# Altium footprint library FOC.PcbLib: 148 footprints (part 8 of 10)
Each footprint in its own frame and in the unit in brackets; x right, y up, seen from the top. Pads: shape width x height; smd on the part's side, far side on the other; paste and mask are expansions set on the pad; w line width, h text height; cw(c..) or ccw(c..) is an arc to the next point about the centre after c.
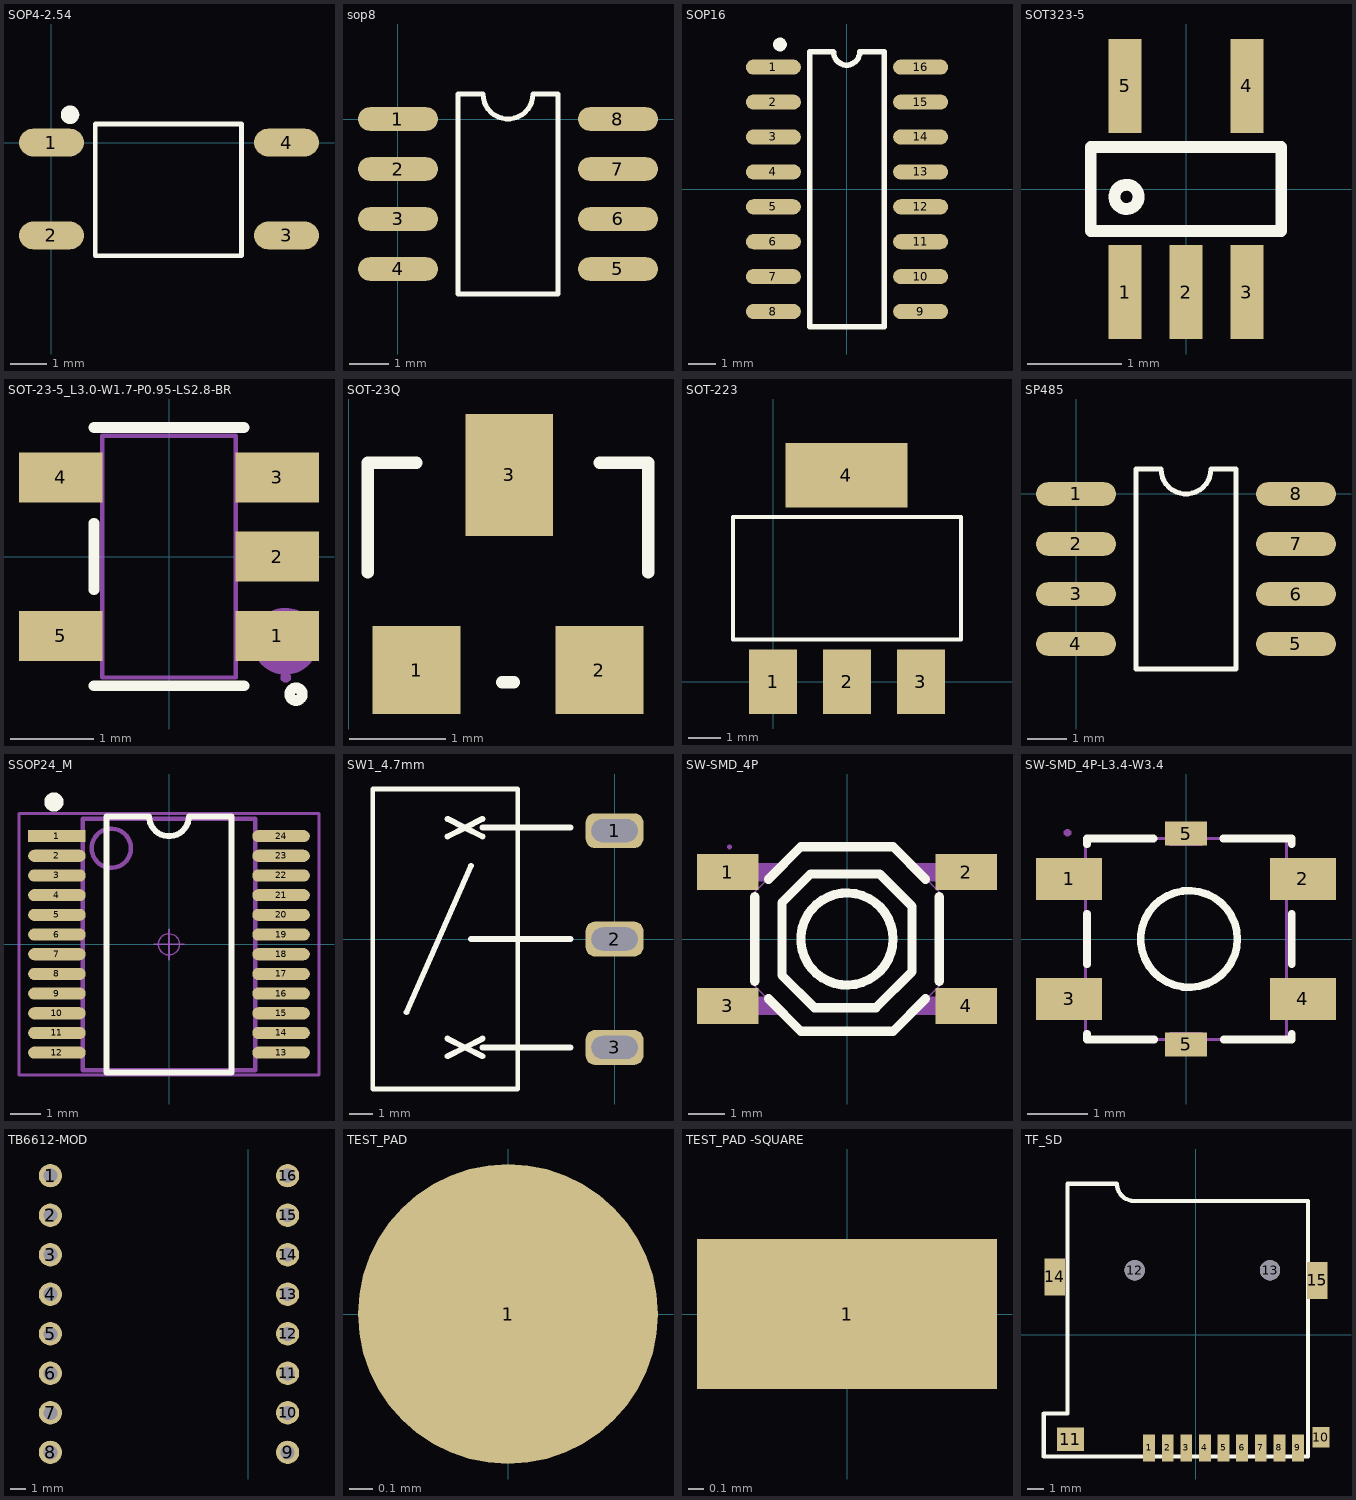
[diagram p7: the footprints below, top view; thin cyan lines are the x and y axes]

## SOP4-2.54 [mil] "间距2.54mm（蒜米工坊）"
pads (4):
  oval 70x30 smd: 1(0,0) 2(0,-100) 3(253.23,-100) 4(253.23,0)
Top Overlay:
  circle w10: c20,30 r4.92
  lines w5: 47.24,-121.73 204.72,-121.73 204.72,20 47.24,20 47.24,-121.73
3D body "SOP-42.STEP": height 78.74, standoff -3.96, extent -12.79,-120.87 262.8,20.87

## sop8 [mil]
height 137.8
pads (8):
  oval 80x23.62 smd: 1(0,0) 2(0,-50) 3(0,-100) 4(0,-150) 5(220,-150) 6(220,-100) 7(220,-50) 8(220,0)
Top Overlay:
  lines w5: 60,-175 60,25 85,25 ccw(c110,25) 135,25 160,25 160,-175 60,-175
3D body "SO8.STEP": height 57, standoff 0, extent -2.75,-172.01 224.74,20.99

## SOP16 [mm] "（蒜米工坊）"
height 1.75
pads (16):
  oval 2x0.55 smd: 1(-2.667,4.445) 2(-2.667,3.175) 3(-2.667,1.905) 4(-2.667,0.635) 5(-2.667,-0.635) 6(-2.667,-1.905) 7(-2.667,-3.175) 8(-2.667,-4.445) 9(2.692,-4.445) 10(2.692,-3.175) 11(2.692,-1.905) 12(2.692,-0.635) 13(2.692,0.635) 14(2.692,1.905) 15(2.692,3.175) 16(2.692,4.445)
Top Overlay:
  circle w0.25: c-2.425,5.27 r0.125
  lines w0.2: -0.483,5 -1.346,5 -1.346,-5 1.372,-5 1.372,5 0.475,5 ; -0.475,4.997 ccw(c0,4.996) 0.475,4.997
3D body "SO-16.STEP": height 1.45, standoff 0, extent -2.921,-4.991 2.984,4.991

## SOT323-5 [mm] "SC70"
pads (5):
  rect 0.35x1 smd: 1(-0.65,-1.1) 2(0,-1.1) 3(0.65,-1.1) 4(0.65,1.1) 5(-0.65,1.1)
Top Overlay:
  circle w0.127: c-0.635,-0.084 r0.13
  lines w0.127: -1.016,-0.447 1.016,-0.447 1.016,0.449 -1.016,0.449 -1.016,-0.447
3D body "sot353.step": height 1, standoff 0, extent -1.05,-1.158 1.05,1.142

## SOT-23-5_L3.0-W1.7-P0.95-LS2.8-BR [mm]
pads (5):
  rect 1x0.6 smd: 1(1.3,-0.95) 2(1.3,0) 3(1.3,0.95) 4(-1.3,0.95) 5(-1.3,-0.95)
Top Overlay:
  circle w0.127: c1.524,-1.651 r0.076
  lines w0.127: -0.9,-1.55 0.9,-1.55 ; -0.9,-0.4 -0.9,0.4 ; -0.9,1.55 0.9,1.55
Mechanical 6:
  circle w0.4: c1.397,-1.016 r0.2
Mechanical 15:
  region: 1.46,-1.45 1.46,-1.425 1.425,-1.39 1.375,-1.39 1.34,-1.425 1.34,-1.45 1.34,-1.475 1.375,-1.51 1.425,-1.51 1.46,-1.475
  region: 0.79,-1.15 0.79,-0.75 0.96,-0.75 0.96,-1.15
  region: 0.95,-1.15 0.95,-0.75 1.4,-0.75 1.4,-1.15
  region: 0.79,-0.2 0.79,0.2 0.96,0.2 0.96,-0.2
  region: 0.95,-0.2 0.95,0.2 1.4,0.2 1.4,-0.2
  region: 0.79,0.75 0.79,1.15 0.96,1.15 0.96,0.75
  region: 0.95,0.75 0.95,1.15 1.4,1.15 1.4,0.75
  region: -0.96,0.75 -0.96,1.15 -0.79,1.15 -0.79,0.75
  region: -1.4,0.75 -1.4,1.15 -0.95,1.15 -0.95,0.75
  region: -0.96,-1.15 -0.96,-0.75 -0.79,-0.75 -0.79,-1.15
  region: -1.4,-1.15 -1.4,-0.75 -0.95,-0.75 -0.95,-1.15
  lines w0.051: -0.8,-1.45 0.8,-1.45 0.8,1.45 -0.8,1.45 -0.8,-1.45
3D body "AADA.STEP": height 1.2, standoff -0.05, extent -1.506,-1.45 1.506,1.45

## SOT-23Q [mil]
pads (3):
  rect 36x36 smd: 1(27.75,-120.28) 2(102.75,-120.28)
  rect 36x50 smd: 3(65.75,-40.28)
Top Overlay:
  lines w5: 7.75,-80.28 7.75,-35.28 27.75,-35.28 ; 62.76,-125.28 67.75,-125.28 ; 102.75,-35.28 122.75,-35.28 122.75,-80.28
3D body "CircuitWorks-SOT-23.step": height 41.65, standoff -1.65, extent 5.94,-124.21 124.06,-25.79

## SOT-223 [mil]
pads (4):
  rect 59x79 smd: 1(0,0) 2(90.55,0) 3(181.1,0)
  rect 150x79 smd: 4(89.88,253.54)
Top Overlay:
  lines w5: -49.45,52 230.55,52 230.55,202 -49.45,202 -49.45,52
3D body "User Library-SOT-223-4.STEP": height 64.96, standoff 0, extent -37.95,-14.5 217.96,264.51

## SP485 [mil]
height 137.8
pads (8):
  oval 80x23.62 smd: 1(0,0) 2(0,-50) 3(0,-100) 4(0,-150) 5(220,-150) 6(220,-100) 7(220,-50) 8(220,0)
Top Overlay:
  lines w5: 60,-175 160,-175 160,25 135,25 cw(c110,25) 85,25 60,25 60,-175
3D body "SO8.STEP": height 57, standoff 0, extent -2.75,-172.01 224.74,20.99

## SSOP24_M [mm] "8.3*7.8*1.6（长宽高）"
pads (24):
  rect 1.9x0.4 smd: 1(-3.7,3.575)
  oval 1.9x0.4 smd: 2(-3.7,2.925) 3(-3.7,2.275) 4(-3.7,1.625) 5(-3.7,0.975) 6(-3.7,0.325) 7(-3.7,-0.325) 8(-3.7,-0.975) 9(-3.7,-1.625) 10(-3.7,-2.275) 11(-3.7,-2.925) 12(-3.7,-3.575) 13(3.7,-3.575) 14(3.7,-2.925) 15(3.7,-2.275) 16(3.7,-1.625) 17(3.7,-0.975) 18(3.7,-0.325) 19(3.7,0.325) 20(3.7,0.975) 21(3.7,1.625) 22(3.7,2.275) 23(3.7,2.925) 24(3.7,3.575)
Top Overlay:
  circle w0.381: c-3.8,4.7 r0.127
  lines w0.2: -2.065,-4.225 2.065,-4.225 2.065,4.225 0.655,4.225 cw(c0,4.225) -0.655,4.225 -2.065,4.225 -2.065,-4.225
Mechanical 13:
  circle w0.15: c-1.905,3.175 r0.648
  lines w0.15: -2.85,-4.15 2.85,-4.15 2.85,4.15 -2.85,4.15 -2.85,-4.15
Mechanical 15:
  circle w0.05: c0,0 r0.35
  lines w0.05: -0.5,0 0.5,0 ; 0,-0.5 0,0.5
  lines w0.1: -4.953,-4.318 4.953,-4.318 4.953,4.318 -4.953,4.318 -4.953,-4.318
3D body "SSOP24.STEP": height 1.65, standoff -0.03, extent -3.852,-4.15 3.852,4.15

## SW1_4.7mm [mm]
pads (3):
  rrect50% 2.5x1.5 hole 1 slot 2 at 0 deg: 1(0,4.699) 2(0,0) 3(0,-4.699)
Top Overlay:
  lines w0.2: -10.485,6.5 -4.191,6.5 -4.191,-6.5 -10.485,-6.5 -10.485,6.502
  lines w0.254: -9.017,-3.175 -6.223,3.175 ; -7.239,-5.08 -6.477,-4.699 ; -7.239,-4.318 -6.477,-4.699 ; -7.239,4.445 -6.477,4.826 ; -7.239,5.207 -6.477,4.826 ; -6.223,0 -4.191,0 -1.905,0 ; -5.715,-5.08 -6.477,-4.699 ; -5.715,-4.699 -4.191,-4.699 -1.905,-4.699 ; -5.715,-4.318 -6.477,-4.699 ; -5.715,4.445 -6.477,4.826 ; -5.715,4.826 -4.191,4.826 -1.905,4.826 ; -5.715,5.207 -6.477,4.826

## SW-SMD_4P [mm]
pads (4):
  rect 1.7x1 smd: 1(-3.3,1.85) 2(3.3,1.85) 3(-3.3,-1.85) 4(3.3,-1.85)
Top Overlay:
  circle w0.254: c0,0 r1.275
  lines w0.254: -2.55,-1.168 -2.55,1.168 ; -2.17,-1.655 -1.275,-2.55 1.275,-2.55 2.17,-1.655 ; -2.17,1.655 -1.275,2.55 1.275,2.55 2.17,1.655 ; 2.55,-1.168 2.55,1.168 ; -1.801,-0.998 -0.899,-1.9 0.8,-1.9 1.801,-0.899 1.801,0.899 0.899,1.801 -1.001,1.801 -1.801,1.001 -1.801,-0.998
Mechanical 15:
  region: -3.19,2.55 -3.19,2.575 -3.225,2.61 -3.275,2.61 -3.31,2.575 -3.31,2.55 -3.31,2.525 -3.275,2.49 -3.225,2.49 -3.19,2.525
  region: 2.85,-2.1 2.85,-1.6 3.25,-1.6 3.25,-2.1
  region: 2.2,1.6 1.7,2.1 2.86,2.1 2.86,1.6
  region: 2.85,1.6 2.85,2.1 3.25,2.1 3.25,1.6
  region: -3.25,1.599 -3.25,2.099 -2.85,2.099 -2.85,1.599
  region: -3.25,-2.1 -3.25,-1.6 -2.85,-1.6 -2.85,-2.1
  region: -2.2,-1.6 -1.7,-2.1 -2.86,-2.1 -2.86,-1.6
  region: 2.201,-1.601 1.701,-2.101 2.861,-2.101 2.861,-1.601
  region: -2.2,1.599 -1.7,2.099 -2.86,2.1 -2.86,1.6
  lines w0.051: -2.55,-1.3 -1.3,-2.55 1.3,-2.55 2.55,-1.3 2.55,1.3 1.3,2.55 -1.3,2.55 -2.55,1.3 -2.55,-1.3

## SW-SMD_4P-L3.4-W3.4 [mm]
pads (6):
  rect 1.1x0.7 smd: 1(-1.95,1) 2(1.95,1) 3(-1.95,-1) 4(1.95,-1)
  rect 0.7x0.4 smd: 5(0,-1.755) 5(0,1.755)
Top Overlay:
  circle w0.127: c0.05,0 r0.806
  lines w0.127: -1.65,-1.581 -1.65,-1.675 -0.531,-1.675 ; -1.65,-0.419 -1.65,0.419 ; -1.65,1.581 -1.65,1.675 -0.541,1.675 ; 0.621,1.675 1.75,1.675 ; 0.631,-1.675 1.76,-1.675 1.76,-1.581 ; 1.76,-0.419 1.76,0.419 ; 1.76,1.581 1.76,1.675
Mechanical 15:
  region: 0.27,-1.555 0.27,-1.675 -0.27,-1.675 -0.27,-1.555
  region: -0.27,1.555 -0.27,1.675 0.27,1.675 0.27,1.555
  region: -1.975,0.825 -1.975,1.175 -1.625,1.175 -1.625,0.825
  region: 1.625,0.825 1.625,1.175 1.975,1.175 1.975,0.825
  region: -1.975,-1.175 -1.975,-0.825 -1.625,-0.825 -1.625,-1.175
  region: 1.625,-1.175 1.625,-0.825 1.975,-0.825 1.975,-1.175
  region: -1.915,1.77 -1.915,1.795 -1.95,1.83 -2,1.83 -2.035,1.795 -2.035,1.77 -2.035,1.745 -2,1.71 -1.95,1.71 -1.915,1.745
  lines w0.051: -1.675,-1.675 1.675,-1.675 1.675,1.675 -1.675,1.675 -1.675,-1.675
3D body "SMD.STEP": height 1.95, standoff 0, extent -2.398,-1.433 2.402,1.467

## TB6612-MOD [mm]
pads (16):
  round 1.5 hole 0.9: 1(-12.7,40.64) 2(-12.7,38.1) 3(-12.7,35.56) 4(-12.7,33.02) 5(-12.7,30.48) 6(-12.7,27.94) 7(-12.7,25.4) 8(-12.7,22.86) 9(2.54,22.86) 10(2.54,25.4) 11(2.54,27.94) 12(2.54,30.48) 13(2.54,33.02) 14(2.54,35.56) 15(2.54,38.1) 16(2.54,40.64)
3D body "1001-8.STEP": height 10.5, standoff -1.04, extent -13.97,21.666 -11.43,41.986
3D body "1001-8.STEP": height 10.5, standoff -1.04, extent 1.27,21.641 3.81,41.961
3D body "TB6612 MOD.step": height 13.7, standoff 7.59, extent -14.275,21.438 4.013,42.266

## TEST_PAD [mm]
pads (1):
  round 1.3 smd: 1(0,0)

## TEST_PAD -SQUARE [mm]
pads (1):
  rect 2x1 smd: 1(0,0)

## TF_SD [mm]
height 3.5
pads (15):
  rect 0.7x1.6 smd: 1(-2.769,-6.706) 2(-1.669,-6.706) 3(-0.569,-6.706) 4(0.531,-6.706) 5(1.631,-6.706) 6(2.731,-6.706) 7(3.831,-6.706) 8(4.931,-6.706) 9(6.031,-6.706)
  rect 1x1.2 smd: 10(7.391,-6.071)
  rect 1.6x1.4 smd: 11(-7.419,-6.198)
  round 1.2 hole 1.2: 12(-3.619,3.802) 13(4.381,3.802)
  rect 1.2x2.2 smd: 14(-8.357,3.402) 15(7.181,3.2)
Top Overlay:
  lines w0.254: -1.02,7.899 6.629,7.899 6.629,-7.214 -8.484,-7.214 -8.992,-7.214 -8.992,-4.674 -7.595,-4.674 -7.595,8.915 -4.674,8.915 ccw(c-3.658,8.915) -3.658,7.899 -3.277,7.899 -0.483,7.899
3D body "User Library-Micro SD.step": height 2, standoff -0.47, extent -8.636,-7.391 7.671,7.819